# Altium schematic symbol library GN-1846-E-V2_Library.SchLib: 99 symbols (part 7 of 7) (continued)
## HI3531AV100_M2_17 (continued)
part C pins: A24 VI0_DAT0/GPIO1_0, A25 VI0_DAT2/GPIO1_2, A27 VI1_DAT2/GPIO2_2, A28 VI2_CLK/GPIO21_3/VI_ADC_REFCLK1, A29 VI2_DAT1/GPIO3_1, A30 VI2_DAT3/GPIO3_3, A31 VI2_DAT5/GPIO3_5, A32 VI3_CLK/GPIO21_4/VI2_CLK, B24 VI0_CLK/GPIO21_0/VI_ADC_REFCLK0, B25 VI0_DAT3/GPIO1_3, B26 VI1_CLK/GPIO21_1/VI0_CLK, B27 VI1_DAT1/GPIO2_1, B29 VI2_DAT0/GPIO3_0, B30 VI2_DAT4/GPIO3_4, B31 VI2_DAT6/GPIO3_6, B32 VI3_DAT1/GPIO4_1, B33 VI3_DAT2/GPIO4_2, C25 VI0_DAT1/GPIO1_1, C27 VI1_DAT0/GPIO2_0, C28 GPIO21_2/VI_ADC_REFCLK0/VI1_CLK, C30 VI2_DAT2/GPIO3_2, C31 VI3_DAT0/GPIO4_0, C32 VI3_DAT3/GPIO4_3, C33 VI3_DAT4/GPIO4_4, D25 VI0_DAT4/GPIO1_4, D27 VI1_DAT4/GPIO2_4, D28 VI1_DAT6/GPIO2_6, D29 VI2_DAT7/GPIO3_7, D30 GPIO11_1/I2S0_WS_RX, D31 VI3_DAT5/GPIO4_5, D32 VI3_DAT6/GPIO4_6, E25 VI0_DAT5/GPIO1_5, E26 VI0_DAT6/GPIO1_6, E27 VI1_DAT3/GPIO2_3, E28 VI1_DAT7/GPIO2_7, E29 GPIO11_2/I2S0_SD_RX, E31 VI3_DAT7/GPIO4_7, E32 GPIO21_5/VI_ADC_REFCLK1/VI3_CLK, F26 VI0_DAT7/GPIO1_7, F27 VI1_DAT5/GPIO2_5, F28 GPIO11_0/I2S0_BCLK_RX, F29 VI4_DAT1/GPIO5_1, F30 VI4_DAT0/GPIO5_0, F31 VI4_CLK/GPIO21_6/VI_ADC_REFCLK2, F32 VI4_DAT5/GPIO5_5, F33 VI4_DAT4/GPIO5_4, G28 VI4_DAT2/GPIO5_2, G29 VI4_DAT3/GPIO5_3, G30 VI5_DAT0/GPIO6_0, G32 VI4_DAT6/GPIO5_6, H29 VI5_DAT1/GPIO6_1, H30 VI5_DAT2/GPIO6_2, H31 VI4_DAT7/GPIO5_7, H32 VI5_CLK/GPIO21_7/VI4_CLK, J28 VI5_DAT3/GPIO6_3, J29 VI5_DAT4/GPIO6_4, J30 VI5_DAT5/GPIO6_5, J31 GPIO12_1/VI_ADC_REFCLK2/VI5_CLK, J32 VI5_DAT7/GPIO6_7, J33 VI5_DAT6/GPIO6_6, K25 DVDD3318_VI_1, K28 GPIO11_3/I2S1_BCLK_RX, K29 GPIO11_4/I2S1_WS_RX, K32 VI6_CLK/GPIO12_2/VI_ADC_REFCLK3, L25 DVDD3318_VI_2, L29 GPIO11_5/I2S1_SD_RX, L30 VI6_DAT0/GPIO7_0, L31 VI6_DAT4/GPIO7_4, L32 VI6_DAT6/GPIO7_6, L33 VI6_DAT5/GPIO7_5, M25 DVDD3318_VI_3, M28 VI6_DAT1/GPIO7_1, M29 VI6_DAT2/GPIO7_2, M32 VI7_CLK/GPIO15_7/VI6_CLK, M33 VI6_DAT7/GPIO7_7, N25 DVDD3318_VI_4, N28 VI6_DAT3/GPIO7_3, N29 VI7_DAT0/GPIO8_0, N30 VI7_DAT1/GPIO8_1, N31 VI7_DAT5/GPIO8_5, N32 VI7_DAT6/GPIO8_6, P25 DVDD3318_VI_5, P28 VI7_DAT4/GPIO8_4, P29 VI7_DAT2/GPIO8_2, P30 VI7_DAT3/GPIO8_3, P31 VI7_DAT7/GPIO8_7, P33 GPIO20_6/VI_ADC_REFCLK3/VI7_CLK, R25 DVDD3318_VI_6, R29 SPI_CSN0/PCIE_SATA_MODE0, R31 GPIO13_0/SPI_SCLK/I2C1_SCL, R32 GPIO13_2/SPI_SDI, R33 TEST_CLK/SPI_SDO/I2C1_SDA, T28 SPI_CSN3/PCIE_SATA_MODE3, T29 SPI_CSN1/PCIE_SATA_MODE1, T30 SPI_CSN2/PCIE_SATA_MODE2
part D pins: A10 GPIO14_0/USB2_OVRCUR, A11 USB2_DP, AA20 AVSS_SATA0_1, AA21 AVSS_SATA2_1, AA22 AVDD_SATA2, AB20 AVDD_SATA0, AB21 AVDD_SATA1, AB22 AVSS_SATA1_1, AC25 AVDD33_SATA3, AC26 AVSS_SATA3_2, AD22 AVDD33_SATA0, AD23 AVDD33_SATA1, AD25 AVDD33_SATA2, AD26 AVSS_SATA2_2, AE22 AVSS_SATA0_2, AE23 AVSS_SATA1_2, AE29 AVSS_SATA3_3, AE30 AVSS_SATA3_4, AF28 AVSS_SATA3_5, AF29 SATA_TX3P/PCIE0_TX0P, AF30 SATA_TX3M/PCIE0_TX0M, AF31 AVSS_SATA3_6, AF32 SATA_RX3P/PCIE0_RX0P, AF33 SATA_RX3M/PCIE0_RX0M, AG24 AVDD33_USB3, AG25 AVSS_USB3_1, AG28 AVSS_SATA2_3, AG29 AVSS_SATA2_4, AG30 AVSS_SATA2_5, AH25 USB3_REXT, AH26 GPIO14_3/USB3_PWREN, AH27 GPIO14_2/USB3_OVRCUR, AH28 AVSS_SATA1_3, AH29 SATA_TX2P/PCIE1_TX0P/PCIE0_TX1P, AH30 SATA_TX2M/PCIE1_TX0M/PCIE0_TX1M, AH31 AVSS_SATA2_6, AH32 SATA_RX2P/PCIE1_RX0P/PCIE0_RX1P, AH33 SATA_RX2M/PCIE1_RX0M/PCIE0_RX1M, AJ25 AVSS_SATA0_3, AJ26 SATA_TX0P/PCIE1_TX1P/USB3_TXP, AJ27 AVSS_SATA0_4, AJ28 SATA_TX1P/PCIE1_TX0P, AJ29 AVSS_SATA1_4, AJ30 AVSS_SATA2_7, AK26 SATA_TX0M/PCIE1_TX1M/USB3_TXM, AK27 AVSS_SATA0_5, AK28 SATA_TX1M/PCIE1_TX0M, AK29 AVSS_SATA1_5, AK30 AVSS_SATA2_8, AK31 AVSS_SATA2_9, AK32 PCIE_REFCLK0P, AK33 PCIE_REFCLK0M, AL24 AVSS_USB3_2, AL26 AVSS_SATA0_6, AL28 AVSS_SATA1_6, AL30 PCIE_REFCLK1P, AL31 PCIE_REFCLK1M, AM24 USB3_DP, AM26 SATA_RX0P/PCIE1_RX1P/USB3_RXP, AM28 SATA_RX1P/PCIE1_RX0P, AM32 GPIO15_2/SATA_LED_N2, AM33 GPIO15_3/SATA_LED_N3, AN24 USB3_DM, AN26 SATA_RX0M/PCIE1_RX1M/USB3_RXM, AN28 SATA_RX1M/PCIE1_RX0M, AN31 GPIO15_0/SATA_LED_N0, AN32 GPIO15_1/SATA_LED_N1, B10 GPIO14_1/USB2_PWREN, B11 USB2_DM, C11 AVSS_USB2_1, D10 AVSS_USB2_2, D11 USB2_REXT, H14 AVSS_USB2_3, J14 AVDD33_USB2, Y21 AVSS_SATA3_1, Y22 AVDD_SATA3
part E pins: AA29 RSTN, AA30 NF_DQ0/VI8_DAT14/GPIO22_0, AA32 XIN, AA33 XOUT, AB25 AVDD33_RTC, AB26 AVSS_RTC1, AB29 WDG_RSTN/SYS_RSTN_OUT, AB31 RTC_XIN, AB32 RTC_XOUT, AC28 SFC_HOLD_IO3/GPIO19_3, AC29 SFC_DOI/GPIO19_2, AC30 SFC_WP_IO2/GPIO19_1, AC31 AVSS_RTC2, AC32 AVSS_RTC3, AD28 AVSS_RTC4, AD29 SFC_CLK/GPIO24_5/SFC_BOOT_MODE, AD30 SFC_DIO/GPIO19_0, AD32 SFC_CS1N/GPIO19_5, AD33 SFC_CS0N/GPIO19_4, AE28 AVDD_BAT, AG27 AVDD_EFUSE, AH22 TEST_MODE, AH24 POR_ENABLE, AJ23 JTAG_TRSTN/GPIO20_0, AK22 JTAG_EN, AK23 JTAG_TCK/GPIO20_1, AK24 JTAG_TDI/GPIO20_4, AL23 JTAG_TMS/GPIO20_2, AM23 JTAG_TDO/GPIO20_3, C1 PWM_OUT0/GPIO15_4, D1 PWM_OUT2/GPIO15_6, D2 PWM_OUT1/GPIO15_5, T32 NF_RDY1/VI8_CLK/GPIO23_2, U32 NF_RDY0/VI8_DAT1/GPIO23_1, U33 NF_REN/VI8_DAT2/GPIO13_5, V31 NF_CLE/VI8_DAT5/GPIO13_3, V32 NF_CSN0/VI8_DAT3/GPIO23_3, V33 NF_CSN1/VI8_DAT4/GPIO23_4, W28 NF_DQ7/VI8_DAT7/GPIO22_7, W29 NF_DQ5/VI8_DAT9/GPIO22_5, W30 NF_DQ4/VI8_DAT10/GPIO22_4, W31 NF_DQ6/VI8_DAT8/GPIO22_6, W32 NF_WEN/VI8_DAT0/GPIO13_6, W33 NF_ALE/VI8_DAT6/GPIO13_4, Y25 DVDDIO_SFC, Y28 NF_DQ1/VI8_DAT13/GPIO22_1, Y29 NF_DQ3/VI8_DAT11/GPIO22_3, Y30 NF_DQ2/VI8_DAT12/GPIO22_2, Y31 GPIO23_0/VI8_DAT15
part F pins: AB14 AVDD_DDRPLL3, AB15 AVSS_DDRPLL3, AB17 AVDD_DDRPLL4, AB18 AVSS_DDRPLL4, AG8 VDDIO_DDR11, AG9 VDDIO_DDR12, AG11 VDDIO_DDR13, AG12 VDDIO_DDR14, AG14 VDDIO_DDR15, AG15 VDDIO_CK_DDR1, AG17 VDDIO_DDR16, AG18 VDDIO_DDR17, AG20 VDDIO_DDR18, AG21 DDR1_ZQ, AH5 VDDIO_DDR19, AH6 VDDIO_DDR20, AH8 DDR1_DM0, AH11 DDR1_DQ25, AH12 DDR1_DQ17, AH14 DDR1_DQ24, AH17 DDR1_A0, AH19 DDR1_A4, AH20 DDR1_A8, AJ6 DDR1_DQ6, AJ7 DDR1_DQ7, AJ9 DDR1_DQ10, AJ10 DDR1_DQ20, AJ11 DDR1_DQ16, AJ13 DDR1_DQ19, AJ15 DDR1_WE_N, AJ17 DDR1_A12, AJ19 DDR1_A6, AJ21 DDR1_A14, AK5 DDR1_DQ2, AK6 DDR1_DQ4, AK7 DDR1_DQ1, AK8 DDR1_DQ8, AK9 DDR1_DQ14, AK11 DDR1_DM3, AK12 DDR1_DQ23, AK13 DDR1_DM2, AK15 DDR1_CAS_N, AK16 DDR1_A10, AK17 DDR1_A15, AK19 DDR1_A1, AL3 DDR1_DQ13, AL4 DDR1_DQ0, AL6 DDR1_DQS1_N, AL8 DDR1_DQ22, AL9 DDR1_DQ29, AL12 DDR1_DQS3_N, AL14 DDR1_DQ30, AL18 DDR1_ODT, AL19 DDR1_A11, AL20 DDR1_A5, AL21 DDR1_A7, AM3 DDR1_DQ9, AM5 DDR1_DQS0_N, AM6 DDR1_DQS1_P, AM8 DDR1_DQ3, AM9 DDR1_DQ18, AM10 DDR1_DQ31, AM11 DDR1_DQS2_N, AM12 DDR1_DQS3_P, AM14 DDR1_DQ26, AM16 DDR1_CLK_P, AM17 DDR1_CKE, AM18 DDR1_RAS_N, AM19 DDR1_A3, AM20 DDR1_A2, AM21 DDR1_RESET_N, AM22 DDR1_A13, AN2 DDR1_DQ11, AN3 DDR1_DQ15, AN4 DDR1_DM1, AN5 DDR1_DQS0_P, AN7 DDR1_DQ12, AN8 DDR1_DQ5, AN10 DDR1_DQ27, AN11 DDR1_DQS2_P, AN14 DDR1_DQ28, AN15 DDR1_DQ21, AN16 DDR1_CLK_N, AN17 DDR1_BA1, AN18 DDR1_CS_N, AN19 DDR1_BA2, AN21 DDR1_A9, AN22 DDR1_BA0
part G pins: AA2 DDR0_DQS3_P, AA3 DDR0_DQS3_N, AA5 DDR0_DM2, AA12 AVDD_DDRPLL2, AB2 DDR0_DQ26, AB4 DDR0_DQ24, AB6 DDR0_DQ19, AB7 VDDIO_DDR5, AB12 AVSS_DDRPLL2, AC1 DDR0_DQ28, AC2 DDR0_DQ30, AC7 VDDIO_DDR6, AD1 DDR0_DQ21, AD4 DDR0_WE_N, AD5 DDR0_CAS_N, AD6 DDR0_A10, AE1 DDR0_CLK_N, AE2 DDR0_CLK_P, AE3 DDR0_A0, AE5 DDR0_A12, AE6 DDR0_A15, AE7 VDDIO_DDR7, AF1 DDR0_BA1, AF2 DDR0_CKE, AF4 DDR0_A4, AF5 DDR0_A6, AF7 VDDIO_DDR8, AG1 DDR0_CS_N, AG2 DDR0_RAS_N, AG3 DDR0_A1, AG4 DDR0_A11, AG6 VDDIO_DDR9, AG7 VDDIO_DDR10, AH1 DDR0_BA2, AH2 DDR0_ODT, AH3 DDR0_A3, AJ1 DDR0_A5, AJ3 DDR0_A8, AJ4 DDR0_A14, AK1 DDR0_A7, AK2 DDR0_A2, AK3 DDR0_A9, AL1 DDR0_RESET_N, AL2 DDR0_BA0, AM1 DDR0_A13, M1 DDR0_DQ13, M2 DDR0_DQ15, M5 DDR0_DQ0, M6 DDR0_DQ11, N1 DDR0_DQ9, N3 DDR0_DM1, N4 DDR0_DQ6, N5 DDR0_DQ2, N7 DDR0_ZQ, P1 DDR0_DQS0_P, P2 DDR0_DQS0_N, P4 DDR0_DQ7, P6 DDR0_DQ4, P7 VDDIO_DDR1, R2 DDR0_DQS1_P, R3 DDR0_DQS1_N, R4 DDR0_DM0, R5 DDR0_DQ1, T2 DDR0_DQ12, T5 DDR0_DQ8, T7 VDDIO_DDR2, U1 DDR0_DQ14, U3 DDR0_DQ5, U4 DDR0_DQ10, U6 DDR0_DQ3, U7 VDDIO_DDR3, V1 DDR0_DQ22, V2 DDR0_DQ18, V5 DDR0_DQ25, V6 DDR0_DQ20, V12 AVDD_DDRPLL1, W2 DDR0_DQ27, W3 DDR0_DQ29, W4 DDR0_DQ31, W5 DDR0_DQ16, W6 DDR0_DM3, W7 VDDIO_CK_DDR0, W12 AVSS_DDRPLL1, Y1 DDR0_DQS2_P, Y2 DDR0_DQS2_N, Y4 DDR0_DQ17, Y6 DDR0_DQ23, Y7 VDDIO_DDR4
part H pins: AD24 DVDD33_9, AG22 DVDD33_10, E7 DVDD33_1, F5 DVDD_CPU1, F6 DVDD_CPU2, G5 DVDD_CPU3, G6 DVDD_CPU4, G7 DVDD_CPU5, H5 DVDD_CPU6, H6 DVDD_CPU7, H7 DVDD_CPU8, J5 DVDD_CPU9, J6 DVDD_CPU10, J7 DVDD_CPU11, J13 DVDD33_2, J17 DVDD33_3, J21 DVDD33_4, J22 DVDD33_5, L7 DVDD33_6, M12 DVDD_CPU12, M13 DVDD_CPU13, M16 DVDD_CORE1, M17 DVDD_CORE2, M18 DVDD_CORE3, N12 DVDD_CPU14, N13 DVDD_CPU15, N16 DVDD_CORE4, N17 DVDD_CORE5, N18 DVDD_CORE6, P16 DVDD_CORE7, P17 DVDD_CORE8, P18 DVDD_CORE9, R16 DVDD_CORE10, R17 DVDD_CORE11, R18 DVDD_CORE12, T16 DVDD_CORE13, T17 DVDD_CORE14, T18 DVDD_CORE15, U16 DVDD_CORE16, U17 DVDD_CORE17, U18 DVDD_CORE18, U25 DVDD33_7, V16 DVDD_CORE19, V17 DVDD_CORE20, V18 DVDD_CORE21, V21 AVSS_PLL1, V22 AVDD11_PLL, V25 DVDD33_8, W16 DVDD_CORE22, W17 DVDD_CORE23, W18 DVDD_CORE24, W25 AVDD33_PLL, W26 AVSS_PLL2, Y16 DVDD_CORE25, Y17 DVDD_CORE26, Y18 DVDD_CORE27
part I pins: A1 VSS1, A33 VSS2, B9 VSS3, B19 VSS4, B28 VSS5, C3 VSS6, C6 VSS7, C8 VSS8, C10 VSS9, C17 VSS10, C22 VSS11, C24 VSS12, C26 VSS13, C29 VSS14, D4 VSS15, D5 VSS16, D7 VSS17, D9 VSS18, D21 VSS19, D26 VSS20, E4 VSS21, E5 VSS22, E6 VSS23, E30 VSS24, E33 VSS25, F4 VSS26, F7 VSS27, F19 VSS28, F20 VSS29, F21 VSS30, F23 VSS31, F25 VSS32, G4 VSS33, G31 VSS34, H4 VSS35, H11 VSS36, H13 VSS37, H17 VSS38, H21 VSS39, H22 VSS40, H28 VSS41, H33 VSS42, J4 VSS43, J11 VSS44, K4 VSS45, K5 VSS46, K6 VSS47, K7 VSS48, K26 VSS49, K30 VSS50, K31 VSS51, L2 VSS52, L4 VSS53, L5 VSS54, L6 VSS55, L26 VSS56, L28 VSS57, M3 VSS58, M4 VSS59, M7 VSS60, M14 VSS61, M15 VSS62, M19 VSS63, M20 VSS64, M21 VSS65, M22 VSS66, M26 VSS67, M30 VSS68, M31 VSS69, N2 VSS70, N6 VSS71, N14 VSS72, N15 VSS73, N19 VSS74, N20 VSS75, N21 VSS76, N22 VSS77, N26 VSS78, P3 VSS79, P5 VSS80, P12 VSS81, P13 VSS82, P14 VSS83, P15 VSS84, P19 VSS85, P20 VSS86, P21 VSS87, P22 VSS88, P26 VSS89, P32 VSS90, R1 VSS91, R6 VSS92, R7 VSS93, R12 VSS94, R13 VSS95, R14 VSS96, R15 VSS97, R19 VSS98, R20 VSS99, R21 VSS100, R22 VSS101, R26 VSS102, R28 VSS103, R30 VSS104, T3 VSS105, T4 VSS106, T6 VSS107, T12 VSS108, T13 VSS109, T14 VSS110, T15 VSS111, T19 VSS112, T20 VSS113, T21 VSS114, T22 VSS115, T25 VSS116, T26 VSS117, T31 VSS118, U2 VSS119, U5 VSS120
part J pins: AA1 VSS158, AA4 VSS159, AA6 VSS160, AA7 VSS161, AA13 VSS162, AA14 VSS163, AA15 VSS164, AA16 VSS165, AA17 VSS166, AA18 VSS167, AA19 VSS168, AA25 VSS169, AA26 VSS170, AA28 VSS171, AA31 VSS172, AB3 VSS173, AB5 VSS174, AB13 VSS175, AB16 VSS176, AB19 VSS177, AB28 VSS178, AB30 VSS179, AC3 VSS180, AC4 VSS181, AC5 VSS182, AC6 VSS183, AD2 VSS184, AD3 VSS185, AD7 VSS186, AD31 VSS187, AE4 VSS188, AE24 VSS189, AF3 VSS190, AF6 VSS191, AG5 VSS192, AG10 VSS193, AG13 VSS194, AG16 VSS195, AG19 VSS196, AG23 VSS197, AG26 VSS198, AH4 VSS199, AH7 VSS200, AH9 VSS201, AH10 VSS202, AH13 VSS203, AH15 VSS204, AH16 VSS205, AH18 VSS206, AH21 VSS207, AJ2 VSS208, AJ5 VSS209, AJ8 VSS210, AJ12 VSS211, AJ14 VSS212, AJ16 VSS213, AJ18 VSS214, AJ20 VSS215, AJ22 VSS216, AK4 VSS217, AK10 VSS218, AK14 VSS219, AK18 VSS220, AK20 VSS221, AK21 VSS222, AL5 VSS223, AL7 VSS224, AL10 VSS225, AL11 VSS226, AL13 VSS227, AL15 VSS228, AL16 VSS229, AL17 VSS230, AL22 VSS231, AM2 VSS232, AM4 VSS233, AM7 VSS234, AM13 VSS235, AM15 VSS236, AM30 VSS237, AM31 VSS238, AN1 VSS239, AN12 VSS240, AN30 VSS241, AN33 VSS242, U12 VSS121, U13 VSS122, U14 VSS123, U15 VSS124, U19 VSS125, U20 VSS126, U21 VSS127, U22 VSS128, U26 VSS129, U30 VSS130, V3 VSS131, V4 VSS132, V7 VSS133, V13 VSS134, V14 VSS135, V15 VSS136, V19 VSS137, V20 VSS138, V26 VSS139, V29 VSS140, W13 VSS141, W14 VSS142, W15 VSS143, W19 VSS144, W20 VSS145, W21 VSS146, W22 VSS147, Y3 VSS148, Y5 VSS149, Y12 VSS150, Y13 VSS151, Y14 VSS152, Y15 VSS153, Y19 VSS154, Y20 VSS155, Y26 VSS156, Y32 VSS157
part A text: MII_TXCK/RMII_CLK; RMII_TXD0; RMII_TXD1; MISC2 Interface 4 of 10; RMII_TXEN; RMII_RXD0; RMII_RXD1; RMII_CRS_DV; SFC_DEVICE_MODE
part B text: PCIE_REFCLK_SEL; UART0_RTSN; UART0_CTSN; VO/AO Interface 7 of 10; COMBPHY_TEST_OUT0; COMBPHY_TEST_OUT1; COMBPHY_TEST_OUT2; COMBPHY_TEST_OUT3; UART1_RTSN/UART0_RTSN; UART1_CTSN/UART0_CTSN; UART2_RXD/UART0_RTSN; UART2_TXD/UART0_CTSN
part C text: GPIO13_1; AD Interface 6 of 10
part D text: MISC1 Interface 3 of 10
part E text: SYSTEM Interface 5 of 10
part F text: DDR2 Interface 2 of 10
part G text: DDR1 Interface 1 of 10
part H text: POWER Interface 8 of 10
part I text: VSS1 Interface 9 of 10
part J text: VSS2 Interface 10 of 10

## HOLE-8STARS_0
designator M?
PARTS: 1; DEVICE: HOLE-8STARS; PKG_TYPE: HOLE125-8STAR; LEVEL: STD; OriginalSymbolOrigin: (10,60)
pins: 1 GND0, 2 GND1, 3 GND2, 4 GND3, 5 GND4, 6 GND5, 7 GND6, 8 GND7, 9 HOLE

## ID-BOARD_0
designator ID?
PARTS: 1; OriginalSymbolOrigin: (20,20); LEVEL: STD; PKG_TYPE: ID-BOARD; DEVICE: ID-BOARD
pins: 1

## IRM-3638A_0
designator D?
PARTS: 1; DEVICE: IRM-3638A; LEVEL: STD; PKG_TYPE: 3; CODE: 15020097; OriginalSymbolOrigin: (10,50)
pins: 1 OUT, 2 GND, 3 VCC

## L_0
designator L?
PARTS: 1; OriginalSymbolOrigin: (20,20); PKG_TYPE: 2; LEVEL: STD; DEVICE: L
pins: 1 A, 2 B

## L_0_Dup1
designator L?
PARTS: 1; DEVICE: L; LEVEL: STD; PKG_TYPE: 2; OriginalSymbolOrigin: (20,20)
pins: 1 A, 2 B

## LB_0
designator LB?
PARTS: 1; DEVICE: LB; LEVEL: STD; OriginalSymbolOrigin: (20,50)
pins: 1, 2

## LED_0
designator D?
PARTS: 1; OriginalSymbolOrigin: (10,20); DEVICE: LED; PKG_TYPE: 2; LEVEL: STD
pins: 1 A, 2 B

## LED_1
designator D?
PARTS: 1; LEVEL: STD; PKG_TYPE: 2; DEVICE: LED; OriginalSymbolOrigin: (10,20)
pins: 1 A, 2 B

## MIC14_0
designator J?
PARTS: 1; OriginalSymbolOrigin: (-80,160); LEVEL: STD; DEVICE: MIC14; PKG_TYPE: ?; CODE: ?
pins: 1, 2, 3, 4, 5, 6, 7, 8, 9, 10, 11, 12, 13, 14

## MP1494S_0
designator U?  PKG_TYPE: TSOT23-8
PARTS: 1; OriginalSymbolOrigin: (20,90); LEVEL: STD; DEVICE: MP1494S
pins: 1 AAM, 2 IN, 3 SW, 4 GND, 5 BST, 6 EN/SYNC, 7 VCC, 8 FB

## MP1494S_1
designator U?  PKG_TYPE: TSOT23-8
PARTS: 1; OriginalSymbolOrigin: (20,90); LEVEL: STD; DEVICE: MP1494S
pins: 1 AAM, 2 IN, 3 SW, 4 GND, 5 BST, 6 EN/SYNC, 7 VCC, 8 FB

## MP1494S_2
designator U?  PKG_TYPE: TSOT23-8
PARTS: 1; OriginalSymbolOrigin: (20,90); LEVEL: STD; DEVICE: MP1494S
pins: 1 AAM, 2 IN, 3 SW, 4 GND, 5 BST, 6 EN/SYNC, 7 VCC, 8 FB

## MP1494S_3
designator U?  PKG_TYPE: TSOT23-8
PARTS: 1; OriginalSymbolOrigin: (20,90); LEVEL: STD; DEVICE: MP1494S
pins: 1 AAM, 2 IN, 3 SW, 4 GND, 5 BST, 6 EN/SYNC, 7 VCC, 8 FB

## MP1494S_4
designator U?  PKG_TYPE: TSOT23-8
PARTS: 1; OriginalSymbolOrigin: (20,90); LEVEL: STD; DEVICE: MP1494S
pins: 1 AAM, 2 IN, 3 SW, 4 GND, 5 BST, 6 EN/SYNC, 7 VCC, 8 FB

## MP1494S_5
designator U?  PKG_TYPE: TSOT23-8
PARTS: 1; OriginalSymbolOrigin: (20,90); LEVEL: STD; DEVICE: MP1494S
pins: 1 AAM, 2 IN, 3 SW, 4 GND, 5 BST, 6 EN/SYNC, 7 VCC, 8 FB

## MP2161GJ_0
designator U?
FORWARD_PCB: 1; DEVICE: MP2161GJ; LEVEL: STD; OriginalSymbolOrigin: (20,90); PARTS: 1
pins: 1 PG, 2 VIN, 3 SW, 4 PGND, 5 OUT, 6 AGND, 7 FB, 8 EN

## MSW4_0
designator S?
PARTS: 1; DEVICE: TC-108; LEVEL: STD; PKG_TYPE: SW4-PUSH; CODE: 16100016; OriginalSymbolOrigin: (-10,40)
pins: 1, 2, 3, 4

## MSW4_1
designator S?
PARTS: 1; DEVICE: TC-108; LEVEL: STD; PKG_TYPE: SW4-PUSH; CODE: 16100016; OriginalSymbolOrigin: (-10,40)
pins: 1, 2, 3, 4

## MT29F2G08ABAEAWP_0
designator U?
PARTS: 1; DEVICE: MT29F2G08ABAEAWP; LEVEL: STD; OriginalSymbolOrigin: (10,300)
pins: 1 NC1, 2 NC2, 3 NC3, 4 NC4, 5 NC5, 6 NC6, 7 R/B~, 8 ~{RE}, 9 ~{CE}, 10 NC7, 11 NC8, 12 VCC1, 13 VSS1, 14 NC9, 15 NC10, 16 CLE, 17 ALE, 18 ~{WE}, 19 ~{WP}, 20 NC11, 21 NC12, 22 NC13, 23 NC14, 24 NC15, 25 VSS3/NC28, 26 NC16, 27 NC17, 28 NC18, 29 IO_0, 30 IO_1, 31 IO_2, 32 IO_3, 33 NC19, 34 VCC3/NC26, 35 NC20, 36 VSS2, 37 VCC2, 38 NC24/DNU1, 39 VCC4/NC27, 40 NC21, 41 IO_4, 42 IO_5, 43 IO_6, 44 IO_7, 45 NC22, 46 NC23, 47 NC25/DNU2, 48 VSS4/NC29

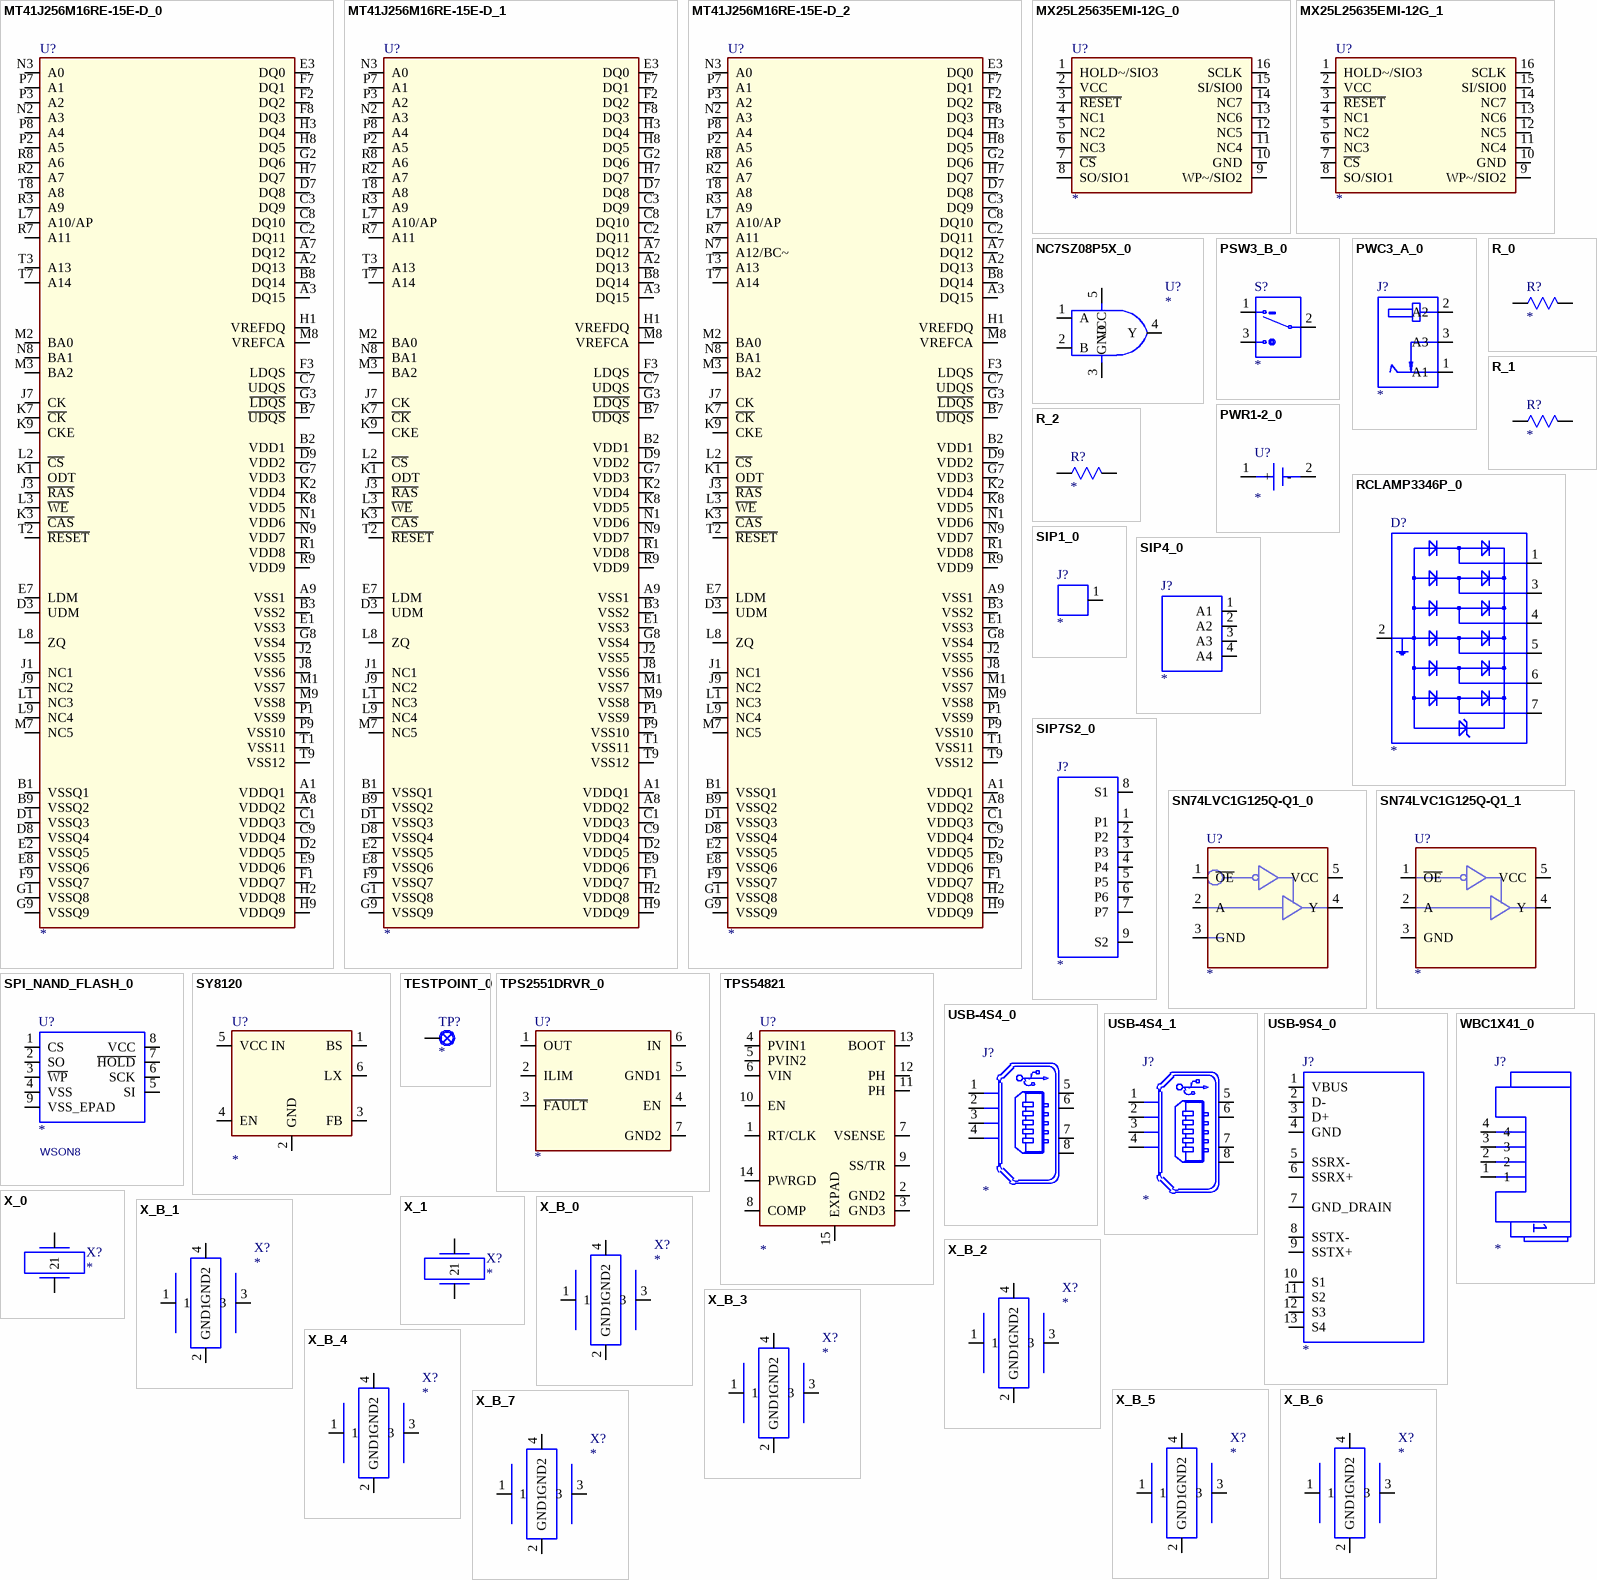
[diagram p77: symbols MT41J256M16RE-15E-D_0 to X_B_7]

## MT41J256M16RE-15E-D_0
designator U?
PARTS: 1; DEVICE: MT41J256M16RE-15E-D; LEVEL: STD; OriginalSymbolOrigin: (10,590)
pins: A1 VDDQ1, A2 DQ13, A3 DQ15, A7 DQ12, A8 VDDQ2, A9 VSS1, B1 VSSQ1, B2 VDD1, B3 VSS2, B7 ~{UDQS}, B8 DQ14, B9 VSSQ2, C1 VDDQ3, C2 DQ11, C3 DQ9, C7 UDQS, C8 DQ10, C9 VDDQ4, D1 VSSQ3, D2 VDDQ5, D3 UDM, D7 DQ8, D8 VSSQ4, D9 VDD2, E1 VSS3, E2 VSSQ5, E3 DQ0, E7 LDM, E8 VSSQ6, E9 VDDQ6, F1 VDDQ7, F2 DQ2, F3 LDQS, F7 DQ1, F8 DQ3, F9 VSSQ7, G1 VSSQ8, G2 DQ6, G3 ~{LDQS}, G7 VDD3, G8 VSS4, G9 VSSQ9, H1 VREFDQ, H2 VDDQ8, H3 DQ4, H7 DQ7, H8 DQ5, H9 VDDQ9, J1 NC1, J2 VSS5, J3 ~{RAS}, J7 CK, J8 VSS6, J9 NC2, K1 ODT, K2 VDD4, K3 ~{CAS}, K7 ~{CK}, K8 VDD5, K9 CKE, L1 NC3, L2 ~{CS}, L3 ~{WE}, L7 A10/AP, L8 ZQ, L9 NC4, M1 VSS7, M2 BA0, M3 BA2, M7 NC5, M8 VREFCA, M9 VSS8, N1 VDD6, N2 A3, N3 A0, N8 BA1, N9 VDD7, P1 VSS9, P2 A5, P3 A2, P7 A1, P8 A4, P9 VSS10, R1 VDD8, R2 A7, R3 A9, R7 A11, R8 A6, R9 VDD9, T1 VSS11, T2 ~{RESET}, T3 A13, T7 A14, T8 A8, T9 VSS12

## MT41J256M16RE-15E-D_1
designator U?
PARTS: 1; DEVICE: MT41J256M16RE-15E-D; LEVEL: STD; OriginalSymbolOrigin: (10,590)
pins: A1 VDDQ1, A2 DQ13, A3 DQ15, A7 DQ12, A8 VDDQ2, A9 VSS1, B1 VSSQ1, B2 VDD1, B3 VSS2, B7 ~{UDQS}, B8 DQ14, B9 VSSQ2, C1 VDDQ3, C2 DQ11, C3 DQ9, C7 UDQS, C8 DQ10, C9 VDDQ4, D1 VSSQ3, D2 VDDQ5, D3 UDM, D7 DQ8, D8 VSSQ4, D9 VDD2, E1 VSS3, E2 VSSQ5, E3 DQ0, E7 LDM, E8 VSSQ6, E9 VDDQ6, F1 VDDQ7, F2 DQ2, F3 LDQS, F7 DQ1, F8 DQ3, F9 VSSQ7, G1 VSSQ8, G2 DQ6, G3 ~{LDQS}, G7 VDD3, G8 VSS4, G9 VSSQ9, H1 VREFDQ, H2 VDDQ8, H3 DQ4, H7 DQ7, H8 DQ5, H9 VDDQ9, J1 NC1, J2 VSS5, J3 ~{RAS}, J7 CK, J8 VSS6, J9 NC2, K1 ODT, K2 VDD4, K3 ~{CAS}, K7 ~{CK}, K8 VDD5, K9 CKE, L1 NC3, L2 ~{CS}, L3 ~{WE}, L7 A10/AP, L8 ZQ, L9 NC4, M1 VSS7, M2 BA0, M3 BA2, M7 NC5, M8 VREFCA, M9 VSS8, N1 VDD6, N2 A3, N3 A0, N8 BA1, N9 VDD7, P1 VSS9, P2 A5, P3 A2, P7 A1, P8 A4, P9 VSS10, R1 VDD8, R2 A7, R3 A9, R7 A11, R8 A6, R9 VDD9, T1 VSS11, T2 ~{RESET}, T3 A13, T7 A14, T8 A8, T9 VSS12

## MT41J256M16RE-15E-D_2
designator U?
PARTS: 1; DEVICE: MT41J256M16RE-15E-D; LEVEL: STD; OriginalSymbolOrigin: (10,590)
pins: A1 VDDQ1, A2 DQ13, A3 DQ15, A7 DQ12, A8 VDDQ2, A9 VSS1, B1 VSSQ1, B2 VDD1, B3 VSS2, B7 ~{UDQS}, B8 DQ14, B9 VSSQ2, C1 VDDQ3, C2 DQ11, C3 DQ9, C7 UDQS, C8 DQ10, C9 VDDQ4, D1 VSSQ3, D2 VDDQ5, D3 UDM, D7 DQ8, D8 VSSQ4, D9 VDD2, E1 VSS3, E2 VSSQ5, E3 DQ0, E7 LDM, E8 VSSQ6, E9 VDDQ6, F1 VDDQ7, F2 DQ2, F3 LDQS, F7 DQ1, F8 DQ3, F9 VSSQ7, G1 VSSQ8, G2 DQ6, G3 ~{LDQS}, G7 VDD3, G8 VSS4, G9 VSSQ9, H1 VREFDQ, H2 VDDQ8, H3 DQ4, H7 DQ7, H8 DQ5, H9 VDDQ9, J1 NC1, J2 VSS5, J3 ~{RAS}, J7 CK, J8 VSS6, J9 NC2, K1 ODT, K2 VDD4, K3 ~{CAS}, K7 ~{CK}, K8 VDD5, K9 CKE, L1 NC3, L2 ~{CS}, L3 ~{WE}, L7 A10/AP, L8 ZQ, L9 NC4, M1 VSS7, M2 BA0, M3 BA2, M7 NC5, M8 VREFCA, M9 VSS8, N1 VDD6, N2 A3, N3 A0, N7 A12/BC~, N8 BA1, N9 VDD7, P1 VSS9, P2 A5, P3 A2, P7 A1, P8 A4, P9 VSS10, R1 VDD8, R2 A7, R3 A9, R7 A11, R8 A6, R9 VDD9, T1 VSS11, T2 ~{RESET}, T3 A13, T7 A14, T8 A8, T9 VSS12

## MX25L25635EMI-12G_0
designator U?
PARTS: 1; DEVICE: MX25L25635EMI-12G; LEVEL: STD; OriginalSymbolOrigin: (10,100)
pins: 1 HOLD~/SIO3, 2 VCC, 3 ~{RESET}, 4 NC1, 5 NC2, 6 NC3, 7 ~{CS}, 8 SO/SIO1, 9 WP~/SIO2, 10 GND, 11 NC4, 12 NC5, 13 NC6, 14 NC7, 15 SI/SIO0, 16 SCLK

## MX25L25635EMI-12G_1
designator U?
PARTS: 1; DEVICE: MX25L25635EMI-12G; LEVEL: STD; OriginalSymbolOrigin: (10,100)
pins: 1 HOLD~/SIO3, 2 VCC, 3 ~{RESET}, 4 NC1, 5 NC2, 6 NC3, 7 ~{CS}, 8 SO/SIO1, 9 WP~/SIO2, 10 GND, 11 NC4, 12 NC5, 13 NC6, 14 NC7, 15 SI/SIO0, 16 SCLK

## NC7SZ08P5X_0
designator U?
PARTS: 1; DEVICE: NC7SZ08P5X; LEVEL: STD; CODE: 36020307; OriginalSymbolOrigin: (20,50); PKG_TYPE: ?
pins: 1 A, 2 B, 3 GND, 4 Y, 5 VCC

## PSW3_B_0
designator S?
PARTS: 1; OriginalSymbolOrigin: (20,50); LEVEL: STD; DEVICE: BR-11C-11P6
pins: 1 P1, 2 P2, 3 P3

## PWC3_A_0
designator J?
PARTS: 1; OriginalSymbolOrigin: (10,70); CODE: 14190002; PKG_TYPE: PWC0103-M-C; LEVEL: STD; DEVICE: DC-005-B
pins: 1 A1, 2 A2, 3 A3

## PWR1-2_0
designator U?
PARTS: 1; DEVICE: RB414_II06E; LEVEL: STD; OriginalSymbolOrigin: (20,30); PKG_TYPE: ?; CODE: ?
pins: 1 +, 2 -

## R_0
designator R?
PARTS: 1; OriginalSymbolOrigin: (10,20); PINSWAP: (A,B); DEVICE: R; PKG_TYPE: 2; LEVEL: STD
pins: 1 A, 2 B

## R_1
designator R?
PARTS: 1; LEVEL: STD; PKG_TYPE: 2; DEVICE: R; PINSWAP: (A,B); OriginalSymbolOrigin: (10,20)
pins: 1 A, 2 B

## R_2
designator R?
PARTS: 1; OriginalSymbolOrigin: (10,20); PINSWAP: (A,B); DEVICE: R; PKG_TYPE: 2; LEVEL: STD
pins: 1 A, 2 B

## RCLAMP3346P_0
designator D?
FORWARD_PCB: 1; DEVICE: RCLAMP3346P; LEVEL: STD; OriginalSymbolOrigin: (20,150); PARTS: 1
pins: 1, 2, 3, 4, 5, 6, 7

## SIP1_0
designator J?
PARTS: 1; DEVICE: 013-0018-192; LEVEL: STD; CODE: 14050248; OriginalSymbolOrigin: (10,30); PKG_TYPE: ?
pins: 1

## SIP4_0
designator J?
PARTS: 1; DEVICE: SP-4; LEVEL: STD; PKG_TYPE: SIP-4P; CODE: 14050069; OriginalSymbolOrigin: (0,50)
pins: 1 A1, 2 A2, 3 A3, 4 A4

## SIP7S2_0
designator J?
PARTS: 1; DEVICE: LD1507-S52; LEVEL: STD; OriginalSymbolOrigin: (10,130)
pins: 1 P1, 2 P2, 3 P3, 4 P4, 5 P5, 6 P6, 7 P7, 8 S1, 9 S2

## SN74LVC1G125Q-Q1_0
designator U?
PARTS: 1; DEVICE: SN74LVC1G125Q-Q1; LEVEL: STD; PKG_TYPE: 5; CODE: 94854; OriginalSymbolOrigin: (10,90)
pins: 1 ~{OE}, 2 A, 3 GND, 4 Y, 5 VCC

## SN74LVC1G125Q-Q1_1
designator U?
PARTS: 1; DEVICE: SN74LVC1G125Q-Q1; LEVEL: STD; PKG_TYPE: 5; CODE: 94854; OriginalSymbolOrigin: (10,90)
pins: 1 ~{OE}, 2 A, 3 GND, 4 Y, 5 VCC

## SPI_NAND_FLASH_0
designator U?  PKG_TYPE: WSON8
PARTS: 1; DEVICE: 8PIN_SPI_FLASH; LEVEL: STD; OriginalSymbolOrigin: (20,70)
pins: 1 CS, 2 SO, 3 ~{WP}, 4 VSS, 5 SI, 6 SCK, 7 ~{HOLD}, 8 VCC, 9 VSS_EPAD

## SY8120
designator U?
footprint SOT23-6
pins: 1 BS, 2 GND, 3 FB, 4 EN, 5 VCC IN, 6 LX

## TESTPOINT_0
designator TP?
PARTS: 1; DEVICE: TEST-SMD; LEVEL: STD; PKG_TYPE: TP24-SMD; OriginalSymbolOrigin: (20,20)
pins: 1

## TPS2551DRVR_0
designator U?
PARTS: 1; DEVICE: TPS2551DRVR; LEVEL: STD; OriginalSymbolOrigin: (10,90)
pins: 1 OUT, 2 ILIM, 3 ~{FAULT}, 4 EN, 5 GND1, 6 IN, 7 GND2

## TPS54821
designator U?
footprint VQFN14
pins: 1 RT/CLK, 2 GND2, 3 GND3, 4 PVIN1, 5 PVIN2, 6 VIN, 7 VSENSE, 8 COMP, 9 SS/TR, 10 EN, 11 PH, 12 PH, 13 BOOT, 14 PWRGD, 15 EXPAD

## USB-4S4_0
designator J?
PARTS: 1; DEVICE: UB3112C-K1; LEVEL: STD; PKG_TYPE: 8; CODE: 121755; OriginalSymbolOrigin: (20,90)
pins: 1, 2, 3, 4, 5 S1, 6 S2, 7 S3, 8 S4

## USB-4S4_1
designator J?
PARTS: 1; DEVICE: UB3112C-K1; LEVEL: STD; PKG_TYPE: 8; CODE: 121755; OriginalSymbolOrigin: (20,90)
pins: 1, 2, 3, 4, 5 S1, 6 S2, 7 S3, 8 S4

## USB-9S4_0
designator J?
PARTS: 1; DEVICE: UEA3119C-4FD1-4F; LEVEL: STD; OriginalSymbolOrigin: (20,190)
pins: 1 VBUS, 2 D-, 3 D+, 4 GND, 5 SSRX-, 6 SSRX+, 7 GND_DRAIN, 8 SSTX-, 9 SSTX+, 10 S1, 11 S2, 12 S3, 13 S4

## WBC1X41_0
designator J?
PARTS: 1; OriginalSymbolOrigin: (10,130); CODE: 14100186; PKG_TYPE: SHEAD-4P-49; LEVEL: STD; DEVICE: WBC1X4
pins: 1, 2, 3, 4

## X_0
designator X?
PARTS: 1; CODE: 12020119; DEVICE: XIHEEC1728; PKG_TYPE: XTAL2-192; LEVEL: STD; OriginalSymbolOrigin: (10,40)
pins: 1, 2

## X_1
designator X?
PARTS: 1; CODE: 12020119; DEVICE: XIHEEC1728; PKG_TYPE: XTAL2-192; LEVEL: STD; OriginalSymbolOrigin: (10,40)
pins: 1, 2

## X_B_0
designator X?
PARTS: 1; DEVICE: X_B; PKG_TYPE: 4; LEVEL: STD; OriginalSymbolOrigin: (20,80); CODE: ?
pins: 1, 2 GND1, 3, 4 GND2

## X_B_1
designator X?
PARTS: 1; DEVICE: X_B; PKG_TYPE: 4; LEVEL: STD; OriginalSymbolOrigin: (20,80); CODE: ?
pins: 1, 2 GND1, 3, 4 GND2

## X_B_2
designator X?
PARTS: 1; DEVICE: X_B; PKG_TYPE: 4; LEVEL: STD; OriginalSymbolOrigin: (20,80); CODE: ?
pins: 1, 2 GND1, 3, 4 GND2

## X_B_3
designator X?
PARTS: 1; DEVICE: X_B; PKG_TYPE: 4; LEVEL: STD; OriginalSymbolOrigin: (20,80); CODE: ?
pins: 1, 2 GND1, 3, 4 GND2

## X_B_4
designator X?
PARTS: 1; DEVICE: X_B; PKG_TYPE: 4; LEVEL: STD; OriginalSymbolOrigin: (20,80); CODE: ?
pins: 1, 2 GND1, 3, 4 GND2

## X_B_5
designator X?
PARTS: 1; DEVICE: X_B; PKG_TYPE: 4; LEVEL: STD; OriginalSymbolOrigin: (20,80); CODE: ?
pins: 1, 2 GND1, 3, 4 GND2

## X_B_6
designator X?
PARTS: 1; DEVICE: X_B; PKG_TYPE: 4; LEVEL: STD; OriginalSymbolOrigin: (20,80); CODE: ?
pins: 1, 2 GND1, 3, 4 GND2

## X_B_7
designator X?
PARTS: 1; DEVICE: X_B; PKG_TYPE: 4; LEVEL: STD; OriginalSymbolOrigin: (20,80); CODE: ?
pins: 1, 2 GND1, 3, 4 GND2